# Altium footprint library TangCW.PcbLib: 46 footprints (part 2 of 3)
Each footprint in its own frame and in the unit in brackets; x right, y up, seen from the top. Pads: shape width x height; smd on the part's side, far side on the other; paste and mask are expansions set on the pad; w line width, h text height; cw(c..) or ccw(c..) is an arc to the next point about the centre after c.
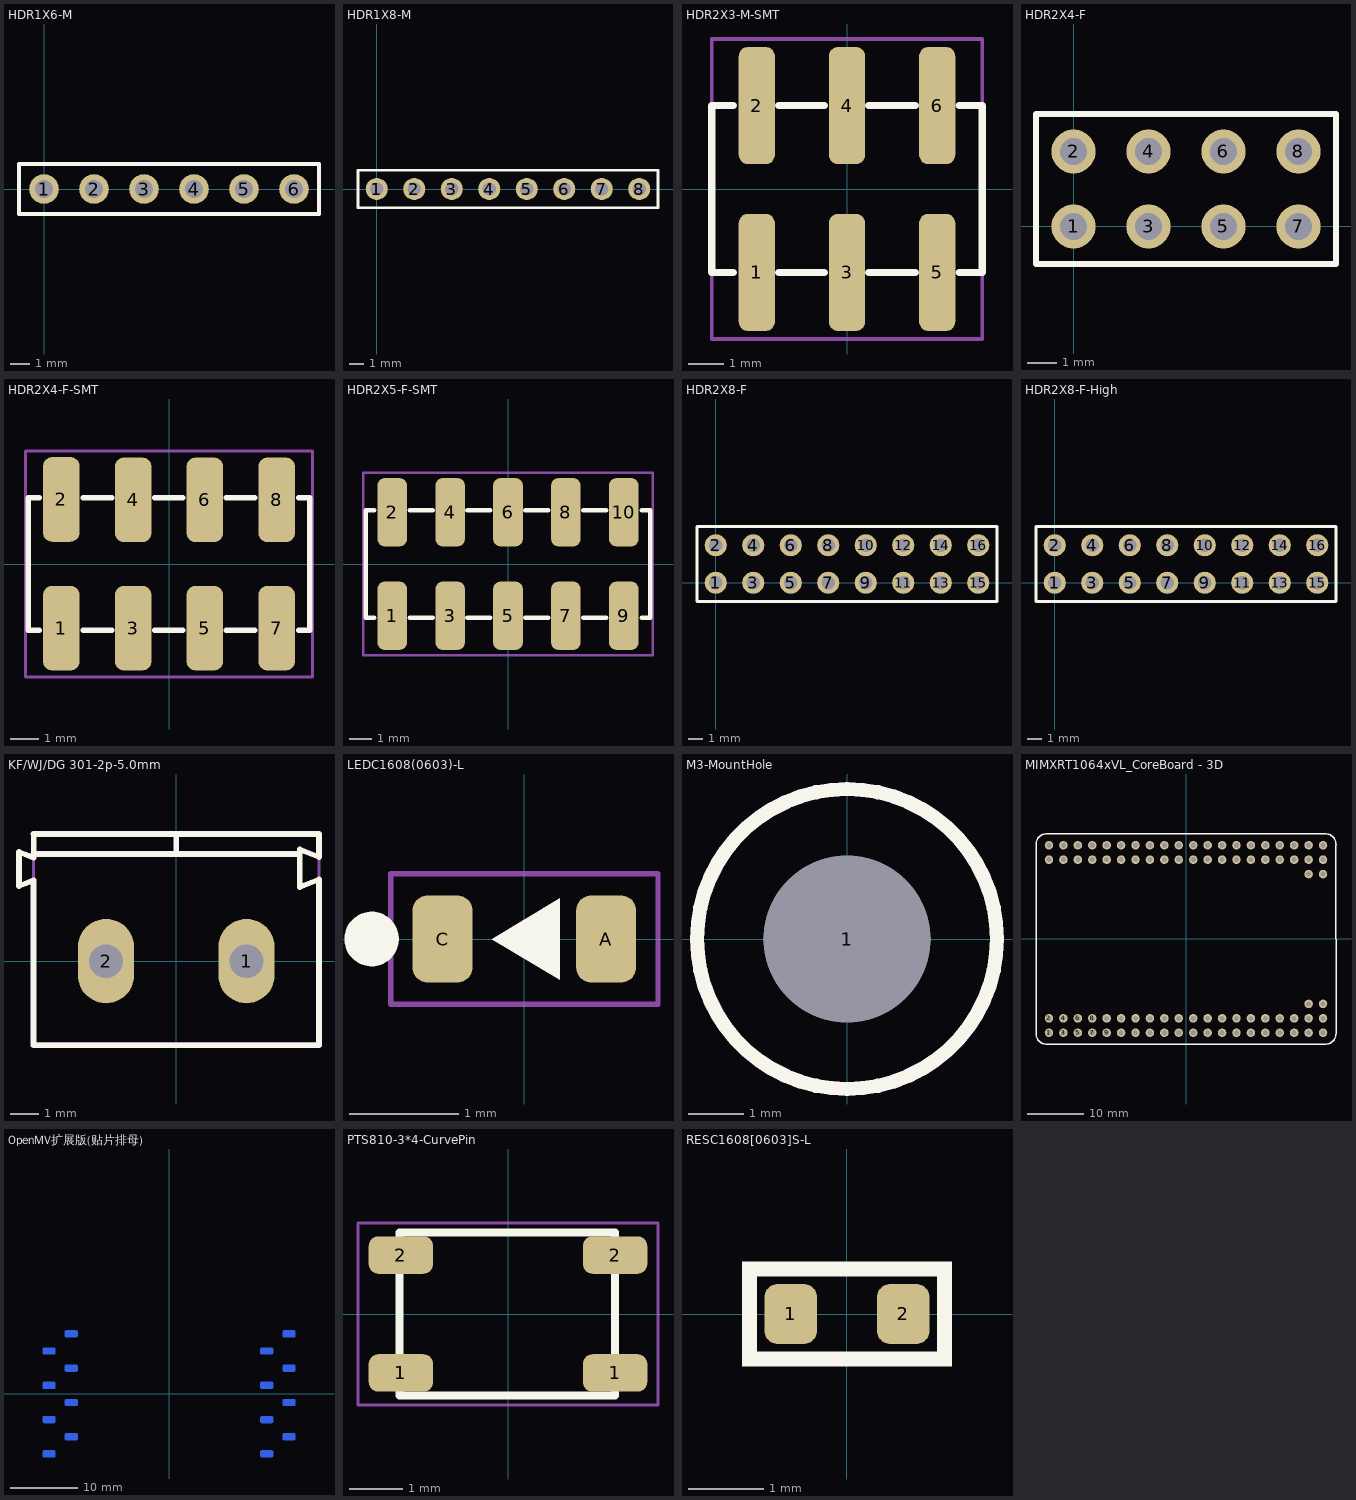
[diagram p1: the footprints below, top view; thin cyan lines are the x and y axes]

## HDR1X6-M [mm]
pads (6):
  round 1.5 hole 0.9: 1(0,0) 2(2.54,0) 3(5.08,0) 4(7.62,0) 5(10.16,0) 6(12.7,0)
Top Overlay:
  lines w0.2: -1.27,-1.27 -1.27,1.27 13.97,1.27 13.97,-1.27 -1.27,-1.27
Top Component Outline:
  lines w0.1: -1.27,-1.27 -1.27,1.27 13.97,1.27 13.97,-1.27 -1.27,-1.27
3D body "1001-6.STEP": height 8.54, standoff -3, extent -1.27,-1.27 13.97,1.27

## HDR1X8-M [mm]
pads (8):
  round 1.5 hole 0.9: 1(0,0) 2(2.54,0) 3(5.08,0) 4(7.62,0) 5(10.16,0) 6(12.7,0) 7(15.24,0) 8(17.78,0)
Top Overlay:
  lines w0.2: -1.27,-1.27 -1.27,1.27 19.05,1.27 19.05,-1.27 -1.27,-1.27
Top Component Outline:
  lines w0.1: -1.27,-1.27 -1.27,1.27 19.05,1.27 19.05,-1.27 -1.27,-1.27
3D body "1001-8.STEP": height 8.54, standoff -3, extent -1.27,-1.27 19.05,1.27

## HDR2X3-M-SMT [mm]
pads (6):
  rrect50% 1.02x3.3 smd: 1(-2.54,-2.35) 2(-2.54,2.35) 3(0,-2.35) 4(0,2.35) 5(2.54,-2.35) 6(2.54,2.35)
Top Overlay:
  lines w0.2: -3.2,-2.35 -3.81,-2.35 -3.81,2.35 -3.2,2.35 ; -1.93,-2.35 -0.635,-2.35 ; -1.93,2.35 -0.635,2.35 ; 0.61,-2.35 1.93,-2.35 ; 0.61,2.35 1.93,2.35 ; 3.15,-2.35 3.81,-2.35 3.81,2.35 3.15,2.35
Top Component Outline:
  lines w0.1: -3.81,-4.225 -3.81,4.225 3.81,4.225 3.81,-4.225 -3.81,-4.225
3D body "61000621121.stp": height 9.67, standoff 0.07, extent -3.81,-3.75 3.81,3.75

## HDR2X4-F [mm]
pads (8):
  round 1.5 hole 0.9: 1(0,0) 2(0,2.54) 3(2.54,0) 4(2.54,2.54) 5(5.08,0) 6(5.08,2.54) 7(7.62,0) 8(7.62,2.54)
Top Overlay:
  lines w0.2: -1.27,-1.27 -1.27,3.81 8.89,3.81 8.89,-1.27 -1.27,-1.27
3D body "3D_openmv扩展版_PCB_2024-09-16.step": height 8.51, standoff -3.19, extent -1.47,-1.23 9.1,3.77

## HDR2X4-F-SMT [mm]
pads (8):
  rrect50% 1.3x3 smd: 1(-3.81,-2.27) 2(-3.81,2.286) 3(-1.27,-2.27) 4(-1.27,2.27) 5(1.27,-2.27) 6(1.27,2.27) 7(3.81,-2.27) 8(3.81,2.27)
Top Overlay:
  lines w0.2: -4.597,-2.35 -4.978,-2.35 -4.978,2.35 -4.597,2.35 ; -3.03,-2.35 -2.03,-2.35 ; -3.03,2.35 -2.03,2.35 ; -0.51,-2.35 0.49,-2.35 ; -0.51,2.35 0.49,2.35 ; 2.03,-2.35 3.03,-2.35 ; 2.03,2.35 3.03,2.35 ; 4.597,-2.35 4.978,-2.35 4.978,2.35 4.597,2.35
Top Component Outline:
  lines w0.1: -5.08,-4 3.825,-4 5.08,-4 5.08,4 -5.08,4 -5.08,-4
3D body "61000821821-无盖.STEP": height 7.47, standoff -0.03, extent -5.08,-3.35 5.08,3.35

## HDR2X5-F-SMT [mm]
pads (10):
  rrect50% 1.3x3 smd: 1(-5.08,-2.27) 2(-5.08,2.27) 3(-2.54,-2.27) 4(-2.54,2.27) 5(0,-2.27) 6(0,2.27) 7(2.54,-2.27) 8(2.54,2.27) 9(5.08,-2.27) 10(5.08,2.27)
Top Overlay:
  lines w0.2: -5.867,-2.35 -6.248,-2.35 -6.248,2.35 -5.867,2.35 ; -4.3,-2.35 -3.3,-2.35 ; -4.3,2.35 -3.3,2.35 ; -1.78,-2.35 -0.78,-2.35 ; -1.78,2.35 -0.78,2.35 ; 0.76,-2.35 1.76,-2.35 ; 0.76,2.35 1.76,2.35 ; 3.3,-2.35 4.3,-2.35 ; 3.3,2.35 4.3,2.35 ; 5.867,-2.35 6.248,-2.35 6.248,2.35 5.867,2.35
Top Component Outline:
  lines w0.1: -6.35,-4 6.35,-4 6.35,4 -6.35,4 -6.35,-4
3D body "61001021821.STEP": height 7.47, standoff -0.03, extent -6.35,-3.42 6.35,3.28

## HDR2X8-F [mm]
pads (16):
  round 1.5 hole 0.9: 1(0,0) 2(0,2.54) 3(2.54,0) 4(2.54,2.54) 5(5.08,0) 6(5.08,2.54) 7(7.62,0) 8(7.62,2.54) 9(10.16,0) 10(10.16,2.54) 11(12.7,0) 12(12.7,2.54) 13(15.24,0) 14(15.24,2.54) 15(17.78,0) 16(17.78,2.54)
Top Overlay:
  lines w0.2: -1.27,-1.27 19.05,-1.27 19.05,3.81 -1.27,3.81 -1.27,-1.27
Top Component Outline:
  lines w0.1: -1.27,-1.27 -1.27,3.81 19.05,3.81 19.05,-1.27 -1.27,-1.27
3D body "3D_openmv扩展版_PCB_2024-09-16.step": height 8.51, standoff -3.19, extent -1.48,-1.23 19.25,3.77

## HDR2X8-F-High [mm]
pads (16):
  round 1.5 hole 0.9: 1(0,0) 2(0,2.54) 3(2.54,0) 4(2.54,2.54) 5(5.08,0) 6(5.08,2.54) 7(7.62,0) 8(7.62,2.54) 9(10.16,0) 10(10.16,2.54) 11(12.7,0) 12(12.7,2.54) 13(15.24,0) 14(15.24,2.54) 15(17.78,0) 16(17.78,2.54)
Top Overlay:
  lines w0.2: -1.27,-1.27 19.05,-1.27 19.05,3.81 -1.27,3.81 -1.27,-1.27
Top Component Outline:
  lines w0.1: -1.27,-1.27 -1.27,3.81 19.05,3.81 19.05,-1.27 -1.27,-1.27
3D body "2x8加高直插排座.step": height 16.2, standoff -3.3, extent -1.52,-1.27 19.3,3.81

## KF/WJ/DG 301-2p-5.0mm [mm]
pads (2):
  oval 2x3 hole 1.2: 1(2.5,0) 2(-2.5,0)
Top Overlay:
  lines w0.2: -5.08,2.879 -5.6,2.676 -5.6,3.886 -5.08,3.683 -5.08,4.525 ; 5.08,-2.997 5.08,2.904 4.394,2.636 4.394,3.976 5.08,3.708 5.08,4.525
  lines w0.203: -5.08,2.879 -5.08,-2.997 5.08,-2.997 ; -5.08,3.81 4.365,3.81 ; -5.08,4.525 5.08,4.525 ; 0,3.81 0,4.445
Top Component Outline:
  lines w0.1: -5.08,-2.921 -5.08,4.572 5.08,4.572 5.08,-2.921 -5.08,-2.921
3D body "Terminal-Screw-3A-2way.step": height 10, standoff -3, extent -5.6,-3 5,4.6

## LEDC1608(0603)-L [mm]
pads (2):
  rrect50% 0.55x0.8 smd: A(0.75,0) C(-0.75,0)
Top Overlay:
  circle w0.25: c-1.4,0 r0.125
  region: -0.3,0 0.325,0.375 0.325,-0.375
Top Component Outline:
  lines w0.05: -1.225,-0.6 1.225,-0.6 1.225,0.6 -1.225,0.6 -1.225,-0.6
3D body "0603 (1608) LED Base (Separate Lens).STEP": height 0.64, standoff 0, extent -0.8,-0.4 0.8,0.4
3D body: height 0.64, standoff 0, extent -0.559,-0.4 0.559,0.4

## M3-MountHole [mm]
pads (1):
  round 3 hole 3 unplated mask+0: 1(0,0)
Top Overlay:
  circle w0.254: c0,0 r2.7
  lines w0.2: -0.4,-0.4 0.4,0.4 ; -0.4,0.4 0.4,-0.4
Bottom Overlay:
  circle w0.254: c0,0 r2.7
Keep-Out Layer:
  circle w0.254: c0,0 r2.7

## MIMXRT1064xVL_CoreBoard - 3D [mm]
pads (84):
  round 1.5 hole 0.9: 1(-24.13,-16.51) 2(-24.13,-13.97) 3(-21.59,-16.51) 4(-21.59,-13.97) 5(-19.05,-16.51) 6(-19.05,-13.97) 7(-16.51,-16.51) 8(-16.51,-13.97) 9(-13.97,-16.51) 10(-13.97,-13.97) 11(-11.43,-16.51) 12(-11.43,-13.97) 13(-8.89,-16.51) 14(-8.89,-13.97) 15(-6.35,-16.51) 16(-6.35,-13.97) 17(-3.81,-16.51) 18(-3.81,-13.97) 19(-1.27,-16.51) 20(-1.27,-13.97) 21(1.27,-16.51) 22(1.27,-13.97) 23(3.81,-16.51) 24(3.81,-13.97) 25(6.35,-16.51) 26(6.35,-13.97) 27(8.89,-16.51) 28(8.89,-13.97) 29(11.43,-16.51) 30(11.43,-13.97) 31(13.97,-16.51) 32(13.97,-13.97) 33(16.51,-16.51) 34(16.51,-13.97) 35(19.05,-16.51) 36(19.05,-13.97) 37(21.59,-16.51) 38(21.59,-13.97) 39(24.13,-16.51) 40(24.13,-13.97) 41(21.59,-11.43) 42(24.13,-11.43) 43(24.13,11.43) 44(21.59,11.43) 45(24.13,13.97) 46(24.13,16.51) 47(21.59,13.97) 48(21.59,16.51) 49(19.05,13.97) 50(19.05,16.51) 51(16.51,13.97) 52(16.51,16.51) 53(13.97,13.97) 54(13.97,16.51) 55(11.43,13.97) 56(11.43,16.51) 57(8.89,13.97) 58(8.89,16.51) 59(6.35,13.97) 60(6.35,16.51) 61(3.81,13.97) 62(3.81,16.51) 63(1.27,13.97) 64(1.27,16.51) 65(-1.27,13.97) 66(-1.27,16.51) 67(-3.81,13.97) 68(-3.81,16.51) 69(-6.35,13.97) 70(-6.35,16.51) 71(-8.89,13.97) 72(-8.89,16.51) 73(-11.43,13.97) 74(-11.43,16.51) 75(-13.97,13.97) 76(-13.97,16.51) 77(-16.51,13.97) 78(-16.51,16.51) 79(-19.05,13.97) 80(-19.05,16.51) 81(-21.59,13.97) 82(-21.59,16.51) 83(-24.13,13.97) 84(-24.13,16.51)
Top Overlay:
  lines w0.254: -26.416,-16.637 ccw(c-24.511,-16.637) -24.511,-18.542 24.511,-18.542 ccw(c24.511,-16.637) 26.416,-16.637 26.416,16.637 ccw(c24.511,16.637) 24.511,18.542 -24.511,18.542 ccw(c-24.511,16.637) -26.416,16.637 -26.416,-16.637
3D body "2x18.stp": height 8.2, standoff -3.35, extent -25.65,12.71 25.65,17.79
3D body "2x18.stp": height 8.2, standoff -3.35, extent -25.65,-17.77 25.65,-12.69
3D body "1x2.stp": height 8.25, standoff -3.36, extent 19.96,10.18 25.54,12.68
3D body "1x2.stp": height 8.25, standoff -3.36, extent 19.96,-12.68 25.54,-10.18
3D body "IMXRT1064-xVL V14.step": height 21.04, standoff 2.29, extent -26.416,-18.542 26.416,18.542

## OpenMV扩展版(贴片排母) [mm]
pads (16):
  rrect50% 1.9x1.02 smd far side: 1(17.779,8.89) 2(14.479,6.35) 3(17.779,3.81) 4(14.479,1.27) 5(17.779,-1.27) 6(14.479,-3.81) 7(17.779,-6.35) 8(14.479,-8.89) 9(-17.779,-8.89) 10(-14.479,-6.35) 11(-17.779,-3.81) 12(-14.479,-1.27) 13(-17.779,1.27) 14(-14.479,3.81) 15(-17.779,6.35) 16(-14.479,8.89)
Bottom Overlay:
  lines w0.24: -17.78,-9.652 -17.78,-10.39 17.78,-10.39 17.78,-7.12 ; -17.78,-8.096 -17.78,-4.556 ; -17.78,-3.024 -17.78,0.516 ; -17.78,2.048 -17.78,5.588 ; -17.78,7.12 -17.78,34.06 17.78,34.06 17.78,9.652 ; -17.399,-9.652 -17.399,-10.16 -14.859,-10.16 -14.859,-7.12 ; -17.399,-8.096 -17.399,-4.556 ; -17.399,-3.024 -17.399,0.516 ; -17.399,2.048 -17.399,5.588 ; -17.399,7.12 -17.399,10.16 -14.859,10.16 -14.859,9.652 ; -14.859,-5.58 -14.859,-2.04 ; -14.859,-0.5 -14.859,3.04 ; -14.859,4.58 -14.859,8.12 ; 14.859,-9.652 14.859,-10.16 17.399,-10.16 17.399,-7.12 ; 14.859,-8.096 14.859,-4.556 ; 14.859,-3.024 14.859,0.516 ; 14.859,2.048 14.859,5.588 ; 14.859,7.12 14.859,10.16 17.399,10.16 17.399,9.652 ; 17.399,-5.58 17.399,-2.04 ; 17.399,-0.5 17.399,3.04 ; 17.399,4.58 17.399,8.12 ; 17.78,-5.58 17.78,-2.04 ; 17.78,-0.5 17.78,3.04 ; 17.78,4.58 17.78,8.12

## PCBComponent_1 [mm]

## PTS810-3*4-CurvePin [mm]
pads (4):
  rrect50% 1.2x0.7 smd: 1(-2,-1.1) 1(2,-1.1) 2(-2,1.1) 2(2,1.1)
Top Overlay:
  lines w0.152: -2.025,-1.524 2,-1.524 2,1.524 -2.025,1.524 -2.025,-1.524
Top Component Outline:
  lines w0.05: -2.8,-1.7 -2.8,1.7 2.8,1.7 2.8,-1.7 -2.8,-1.7
3D body "User Library-PTS810.STEP": height 2.5, standoff 0, extent -2.301,-1.6 2.299,1.6

## RESC1608[0603]S-L [mm]
pads (2):
  rrect50% 0.7x0.8 smd: 1(-0.75,0) 2(0.75,0)
Top Overlay:
  rectangle: -1.4,0.5 1.4,0.7
  region: -1.4,0.7 -1.4,-0.7 -1.2,-0.7 -1.2,0.7
  rectangle: -1.4,-0.7 1.4,-0.5
  region: 1.4,-0.7 1.4,0.7 1.2,0.7 1.2,-0.7
Top Component Outline:
  rectangle: -1.35,-0.65 -1.3,0.65
  region: 1.35,0.6 1.35,0.65 -1.35,0.65 -1.35,0.6
  region: 1.35,0.65 1.3,0.65 1.3,-0.65 1.35,-0.65
  region: -1.35,-0.6 -1.35,-0.65 1.35,-0.65 1.35,-0.6
3D body "R0603.STEP": height 0.45, standoff 0, extent -0.8,-0.4 0.8,0.4